# Altium footprint library Potentiometer.PcbLib: 55 footprints (part 3 of 4)
Each footprint in its own frame and in the unit in brackets; x right, y up, seen from the top. Pads: shape width x height; smd on the part's side, far side on the other; paste and mask are expansions set on the pad; w line width, h text height; cw(c..) or ccw(c..) is an arc to the next point about the centre after c.
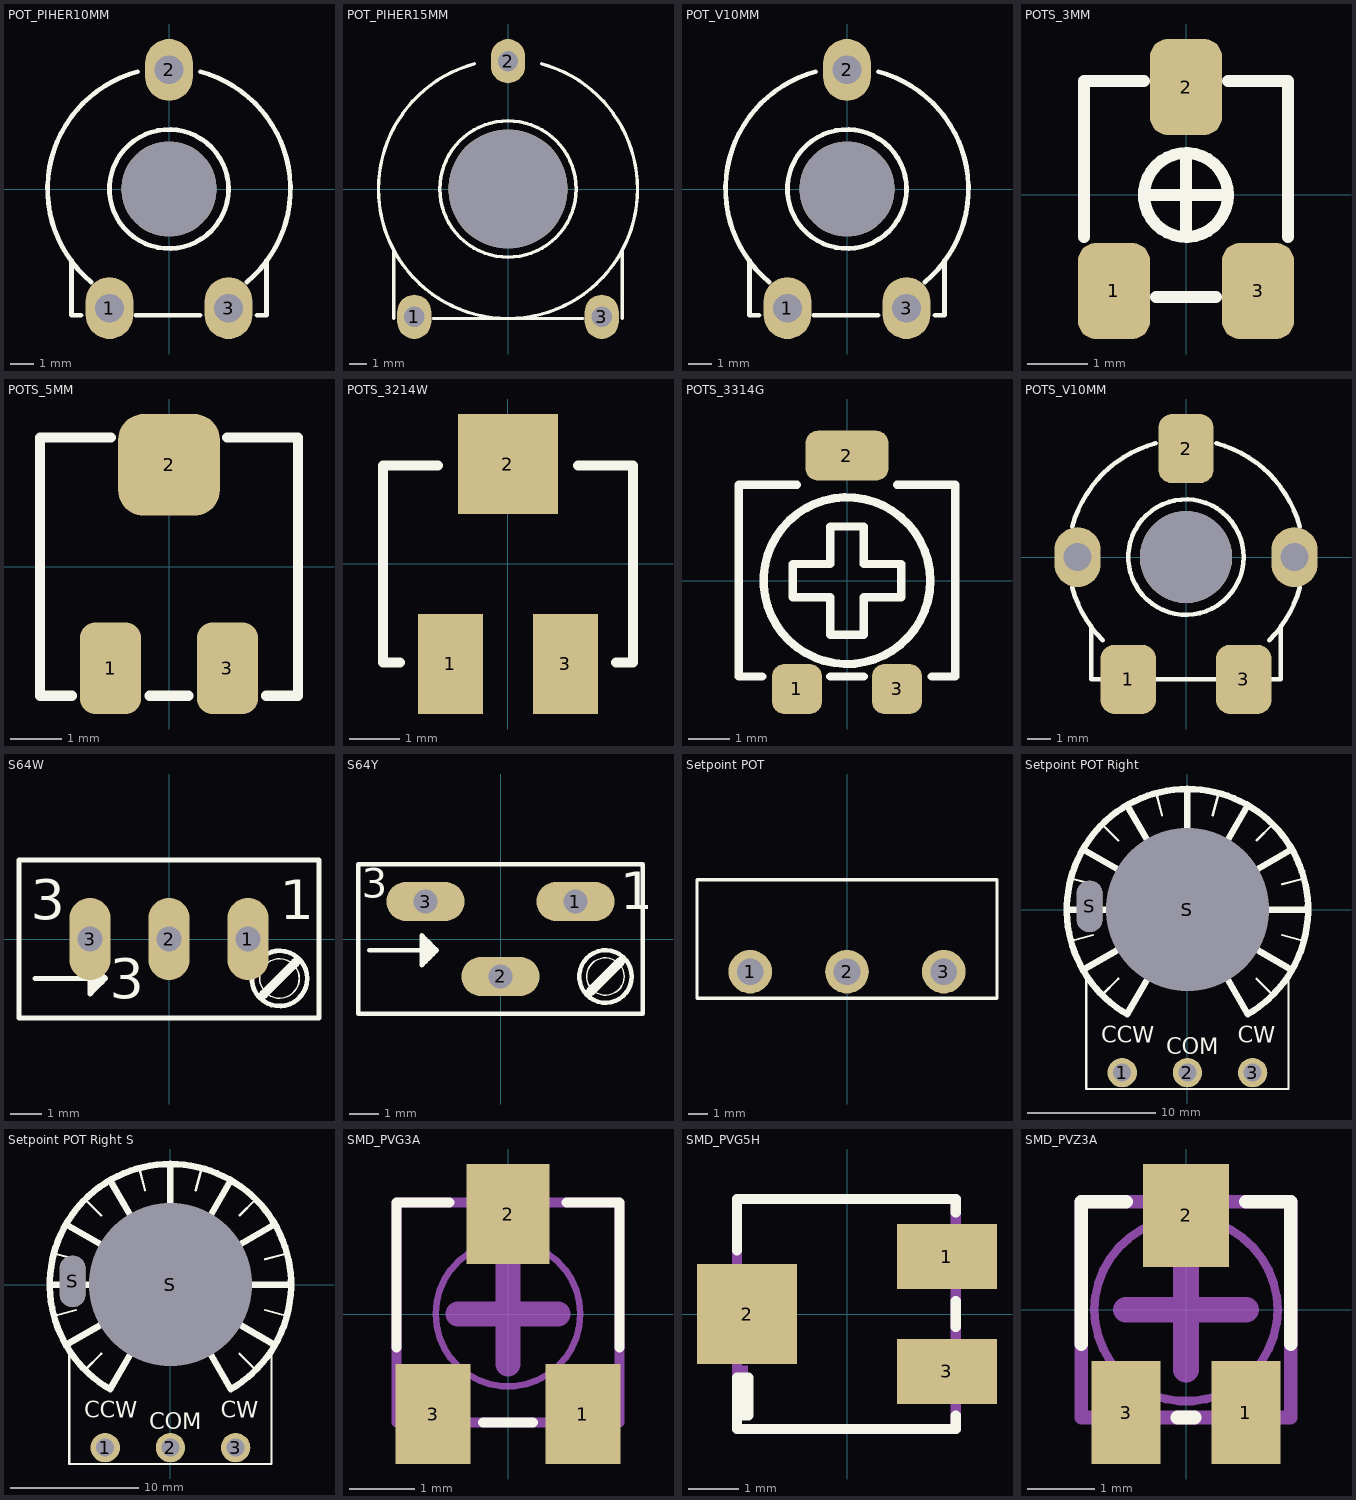
[diagram p2: the footprints below, top view; thin cyan lines are the x and y axes]

## POT_PIHER10MM [mm] "POT, TRIM, PIHER PT-10 10mm"
pads (4):
  oval 2x2.6 hole 1.2: 1(-2.5,-5) 2(0,5) 3(2.5,-5)
  round 4 hole 4 unplated mask+0.1: ""(0,0)
Top Overlay:
  circle w0.2: c0,0 r2.5
  lines w0.2: -4.1,-3 -4.1,-5.3 -3.7,-5.3 ; -3.278,-3.907 cw(c0,0) -1.32,4.926 ; -1.4,-5.3 1.3,-5.3 ; 1.32,4.926 cw(c0,0) 3.278,-3.907 ; 3.7,-5.3 4.1,-5.3 4.1,-3
3D body "User Library-PT10MV.step": height 6.26, standoff -3.5, extent -5.15,-5.069 5.15,5.531

## POT_PIHER15MM [mm] "POT, TRIM, PIHER PT-15 15mm"
pads (4):
  oval 2x2.6 hole 1.2: 1(-5.5,-7.5) 2(0,7.5) 3(5.5,-7.5)
  round 7 hole 7 unplated mask+0.1: ""(0,0)
Top Overlay:
  circle w0.2: c0,0 r4
  lines w0.2: -6.7,-7.6 -6.7,-3.6 ; -4.4,-7.6 4.4,-7.6 ; -1.967,7.341 ccw(c0,0) -7.6,0 ccw(c0,0) 7.6,0 ccw(c0,0) 1.967,7.341 ; 6.7,-7.6 6.7,-3.6
3D body "Trimmer_Piher_PT-15.step": height 6.97, standoff -3.93, extent -7.5,-7.7 7.5,7.697

## POT_V10MM [mm] "POT, TRIM, V-10 10mm"
pads (4):
  oval 2x2.6 hole 1.2: 1(-2.5,-5) 2(0,5) 3(2.5,-5)
  round 4 hole 4 unplated mask+0.1: ""(0,0)
Top Overlay:
  circle w0.2: c0,0 r2.5
  lines w0.2: -4.1,-3 -4.1,-5.3 -3.7,-5.3 ; -3.278,-3.907 cw(c0,0) -1.32,4.926 ; -1.4,-5.3 1.3,-5.3 ; 1.32,4.926 cw(c0,0) 3.278,-3.907 ; 3.7,-5.3 4.1,-5.3 4.1,-3
3D body "User Library-Trimpot V10.step": height 5.9, standoff -3.4, extent -5.15,-5.207 5.15,5.093

## POTS_3MM [mm] "POT SMD, 3.0X3.0mm, Trimming PVG3A PVZ3A"
pads (3):
  rrect50% 1.2x1.6 smd: 1(-1.2,-1.6) 2(0,1.8) 3(1.2,-1.6)
Top Overlay:
  circle w0.2: c0,0 r0.7
  lines w0.2: -1.7,-0.7 -1.7,1.9 -0.7,1.9 ; -0.7,0 0.7,0 ; -0.5,-1.7 0.5,-1.7 ; 0,-0.7 0,0.7 ; 0.7,1.9 1.7,1.9 1.7,-0.7
3D body "User Library-PVZ3A.STEP": height 1.95, standoff 0, extent -1.55,-1.85 1.55,1.84

## POTS_5MM [mm] "POT SMD, 5.0X5.0mm, Trimming PVG5H"
pads (3):
  rrect50% 1.2x1.8 smd: 1(-1.15,-2) 3(1.15,-2)
  rrect50% 2x2 smd: 2(0,2)
Top Overlay:
  lines w0.2: -1.905,-2.54 -2.54,-2.54 -2.54,2.54 -1.143,2.54 ; -0.381,-2.54 0.381,-2.54 ; 1.143,2.54 2.54,2.54 2.54,-2.54 1.905,-2.54
3D body "User Library-PVG5H.STEP": height 3.7, standoff 0, extent -2.4,-2.55 2.4,2.55

## POTS_3214W [mm] "POT SMD, 4.0X5.0mm, Trimming SM-42/43W 3214W"
pads (3):
  rect 1.3x2 smd: 1(-1.15,-2) 3(1.15,-2)
  rect 2x2 smd: 2(0,2)
Top Overlay:
  lines w0.2: -2.159,-1.97 -2.5,-1.97 -2.5,1.97 -1.397,1.97 ; 1.397,1.97 2.5,1.97 2.5,-1.97 2.159,-1.97
3D body "SW3dPS-Pot 3214.STEP": height 5.4, standoff 0, extent -2.4,-1.97 2.4,1.97

## POTS_3314G [mm] "POT SMD, 5.0X5.0mm, Trimming, 3314G"
pads (3):
  rrect50% 1.2x1.2 smd: 1(-1.2,-2.6) 3(1.2,-2.6)
  rrect50% 2x1.2 smd: 2(0,3)
Top Overlay:
  circle w0.2: c0,0 r2
  lines w0.2: -1.3,-0.4 -1.3,0.4 -0.4,0.4 -0.4,1.3 0.4,1.3 0.4,0.4 1.3,0.4 1.3,-0.4 0.4,-0.4 0.4,-1.3 -0.4,-1.3 -0.4,-0.4 -1.3,-0.4
  lines w0.203: -2.032,-2.3 -2.6,-2.3 -2.6,2.3 -1.2,2.3 ; -0.4,-2.3 0.4,-2.3 ; 1.2,2.3 2.6,2.3 2.6,-2.3 2.032,-2.3
3D body "3314g-1-104e.stp": height 2.67, standoff -0.06, extent -2.451,-2.925 2.548,3.272

## POTS_V10MM [mm] "POT, TRIM, V-10 10mm SMD"
pads (6):
  rrect50% 2.4x3 smd: 1(-2.5,-5.3) 2(0,4.7) 3(2.5,-5.3)
  oval 2x2.6 hole 1.2: ""(-4.7,0) ""(4.7,0)
  round 4 hole 4 unplated mask+0.1: ""(0,0)
Top Overlay:
  circle w0.2: c0,0 r2.5
  lines w0.2: -4.926,-1.32 ccw(c0,0) -3.606,-3.606 ; -4.926,1.32 cw(c0,0) -1.32,4.926 ; -4.1,-3 -4.1,-5.3 -3.7,-5.3 ; -1.4,-5.3 1.3,-5.3 ; 1.32,4.926 cw(c0,0) 4.926,1.32 ; 3.606,-3.606 ccw(c0,0) 4.926,-1.32 ; 3.7,-5.3 4.1,-5.3 4.1,-3
3D body "User Library-Trimpot V60.step": height 5.7, standoff -0.85, extent -5.15,-5.742 5.15,5.15

## S64W [mil]
pads (3):
  oval 52x104 hole 32: 1(100,0) 2(0,0) 3(-100,0)
Top Overlay:
  circle w6: c140,-50 r35
  circle w2: c140,-50 r25
  lines w6: -170,-50 -95,-50 ; -95,-65 -90,-60 ; -95,-65 -95,-50 ; -95,-65 -100,-70 -100,-30 -95,-35 ; -95,-50 -80,-50 ; -95,-50 -95,-35 ; -95,-35 -90,-40 ; -90,-60 -90,-40 ; -90,-60 -85,-55 ; -90,-40 -85,-45 ; -85,-55 -80,-50 ; -85,-55 -85,-45 ; -85,-45 -80,-50 ; -190,-100 190,-100 190,100 -190,100 -190,-100
  lines w12: 120,-70 160,-30
  text "3" at -175,25 h50
  text "1" at 140,25 h50
  text "3" at -75,-75 h50
3D body "SW3dPS-bourns 3296W pot.STEP": height 454.72, standoff -251.97, extent -187.19,-96 188,94.2

## S64Y [mil]
pads (3):
  oval 104x52 hole 32: 1(100,50) 2(0,-50) 3(-100,50)
Top Overlay:
  circle w6: c140,-50 r35
  circle w2: c140,-50 r25
  lines w6: -175,-15 -100,-15 ; -100,-30 -95,-25 ; -100,-30 -100,-15 ; -100,-30 -105,-35 -105,5 -100,0 ; -100,-15 -85,-15 ; -100,-15 -100,0 ; -100,0 -95,-5 ; -95,-25 -95,-5 ; -95,-25 -90,-20 ; -95,-5 -90,-10 ; -90,-20 -85,-15 ; -90,-20 -90,-10 ; -90,-10 -85,-15 ; -190,-100 190,-100 190,100 -190,100 -190,-100
  lines w12: 120,-70 160,-30
  text "3" at -185,55 h39.37
  text "1" at 160,40 h50
3D body "SW3dPS-bourns 3296Y pot.STEP": height 454.72, standoff -251.97, extent -187.59,-95 187.6,95.2

## Setpoint POT [mil]
pads (3):
  round 90 hole 55: 1(-200,-500) 2(0,-500) 3(200,-500)
Top Overlay:
  lines w7: -310,-555 310,-555 310,-310 -310,-310 -310,-555
3D body "POT.STEP": height 157.48, standoff -812.52, extent -309.99,-1316.22 310.01,-310
3D body "volome cover2.STEP": height 847.48, standoff 173.82, extent -298.62,-1443.35 298.62,-655.94

## Setpoint POT Right [mil]
pads (5):
  round 90 hole 55: 1(-200,-500) 2(0,-500) 3(200,-500)
  oval 78.74x157.48 hole 78.74 slot 157.48 at 90 deg: S(-300,10)
  round 492.13 hole 500: S(0,0)
Top Overlay:
  lines w7: -357.39,-95.76 -289.78,-77.65 ; -357.39,95.76 -289.78,77.65 ; -310,-200 -310,-550 310,-550 310,-200 ; -261.63,-261.63 -212.13,-212.13 ; -261.63,261.63 -212.13,212.13 ; -95.76,357.39 -77.65,289.78 ; 77.65,289.78 95.76,357.39 ; 212.13,-212.13 261.63,-261.63 ; 212.13,212.13 261.63,261.63 ; 289.78,-77.65 357.39,-95.76 ; 289.78,77.65 357.39,95.76
  lines w20: -370,0 -250,0 ; -320.43,-185 -216.51,-125 ; -320.43,185 -216.51,125 ; -185,320.43 -125,216.51 ; -125,-216.51 -185,-320.43 cw(c0,0) 185,-320.43 125,-216.51 ; 0,250 0,370 ; 125,216.51 185,320.43 ; 216.51,-125 320.43,-185 ; 216.51,125 320.43,185 ; 250,0 370,0
  text "COM" at -65,-443 h50
  text "CW" at 155,-408 h50
  text "CCW" at -264,-408 h50
3D body "POT.STEP": height -85.59, standoff -1091.81, extent -310,-661 310,309

## Setpoint POT Right S [mil]
pads (5):
  round 90 hole 55: 1(-200,-500) 2(0,-500) 3(200,-500)
  oval 78.74x157.48 hole 78.74 slot 157.48 at 90 deg: S(-300,10)
  round 492.13 hole 500: S(0,0)
Top Overlay:
  lines w7: -357.39,-95.76 -289.78,-77.65 ; -357.39,95.76 -289.78,77.65 ; -310,-200 -310,-550 310,-550 310,-200 ; -261.63,-261.63 -212.13,-212.13 ; -261.63,261.63 -212.13,212.13 ; -95.76,357.39 -77.65,289.78 ; 77.65,289.78 95.76,357.39 ; 212.13,-212.13 261.63,-261.63 ; 212.13,212.13 261.63,261.63 ; 289.78,-77.65 357.39,-95.76 ; 289.78,77.65 357.39,95.76
  lines w20: -370,0 -250,0 ; -320.43,-185 -216.51,-125 ; -320.43,185 -216.51,125 ; -185,320.43 -125,216.51 ; -125,-216.51 -185,-320.43 cw(c0,0) 185,-320.43 125,-216.51 ; 0,250 0,370 ; 125,216.51 185,320.43 ; 216.51,-125 320.43,-185 ; 216.51,125 320.43,185 ; 250,0 370,0
  text "CCW" at -264,-408 h50
  text "CW" at 155,-408 h50
  text "COM" at -65,-443 h50
3D body "volome cover2.STEP": height 1240.16, standoff 452.76, extent -298.41,-307.45 298.84,366.2
3D body "POT.STEP": height -85.59, standoff -1091.81, extent -310,-661 310,309

## SMD_PVG3A [mil]
pads (3):
  rect 45x60 smd: 1(45,-60) 3(-45,-60)
  rect 50x60 smd: 2(0,60)
Top Overlay:
  lines w6: -67,-20 -67,67 -35,67 ; -15,-65 15,-65 ; 35,67 67,67 67,-20
Mechanical 1:
  circle w3.94: c0,0 r43.42
  lines w6: -67,-65 -67,67 66.93,67 66.93,-65 -67,-65
  lines w15: -30,0 30,0 ; 0,-30 0,30
3D body "SW3dPS-TRIMMER_PVG3A.STEP": height 78.74, standoff 0, extent -66.92,-70 66.93,71.73

## SMD_PVG5H [mm]
pads (3):
  rect 2x1.3 smd: 1(2,1.15) 3(2,-1.15)
  rect 2x2 smd: 2(-2,0)
Top Overlay:
  region: -1.975,-2.032 -1.975,-1.27 -2.3,-1.27 -2.3,-2.032
  lines w0.203: -2.2,-2.032 -1.975,-2.032 -1.975,-1.27 -2.2,-1.27 -2.2,-2.3 2.175,-2.3 2.175,-2.032 ; -2.2,1.27 -2.2,2.3 2.175,2.3 2.175,2.032 ; 2.175,-0.254 2.175,0.254
Mechanical 1:
  region: 2.5,-1.675 2.5,-0.875 2.2,-0.875 2.2,-1.675
  region: 2.5,0.875 2.5,1.675 2.2,1.675 2.2,0.875
  region: -2.2,-0.65 -2.2,0.65 -2.5,0.65 -2.5,-0.65
  region: -1.975,-2.032 -1.975,-1.025 -2.3,-1.025 -2.3,-2.032
  lines w0.203: -2.2,-2.3 -2.2,2.3 2.175,2.3 2.175,-2.3 -2.2,-2.3
3D body "User Library-PVG5H.STEP": height 3.7, standoff 0, extent -2.55,-2.4 2.55,2.4

## SMD_PVZ3A [mil]
pads (3):
  rect 40x60 smd: 1(35,-60) 3(-35,-60)
  rect 50x60 smd: 2(0,55)
Top Overlay:
  lines w8: -61.02,-20 -61.02,63 -35,63 ; -5,-62.84 5,-62.84 ; 35,63 61.02,63 61.02,-20
Mechanical 1:
  circle w5: c0,0 r53.41
  lines w8: -61.02,-62.84 -61.02,63 61.02,63 61.02,-62.84 -61.02,-62.84
  lines w15: -35,0 35,0 ; 0,-35 0,35
3D body "User Library-PVZ3A.STEP": height 76.77, standoff 0, extent -61.02,-72.83 61.03,72.44